# Altium footprint library core.PcbLib: 29 footprints (part 2 of 2)
Each footprint in its own frame and in the unit in brackets; x right, y up, seen from the top. Pads: shape width x height; smd on the part's side, far side on the other; paste and mask are expansions set on the pad; w line width, h text height; cw(c..) or ccw(c..) is an arc to the next point about the centre after c.
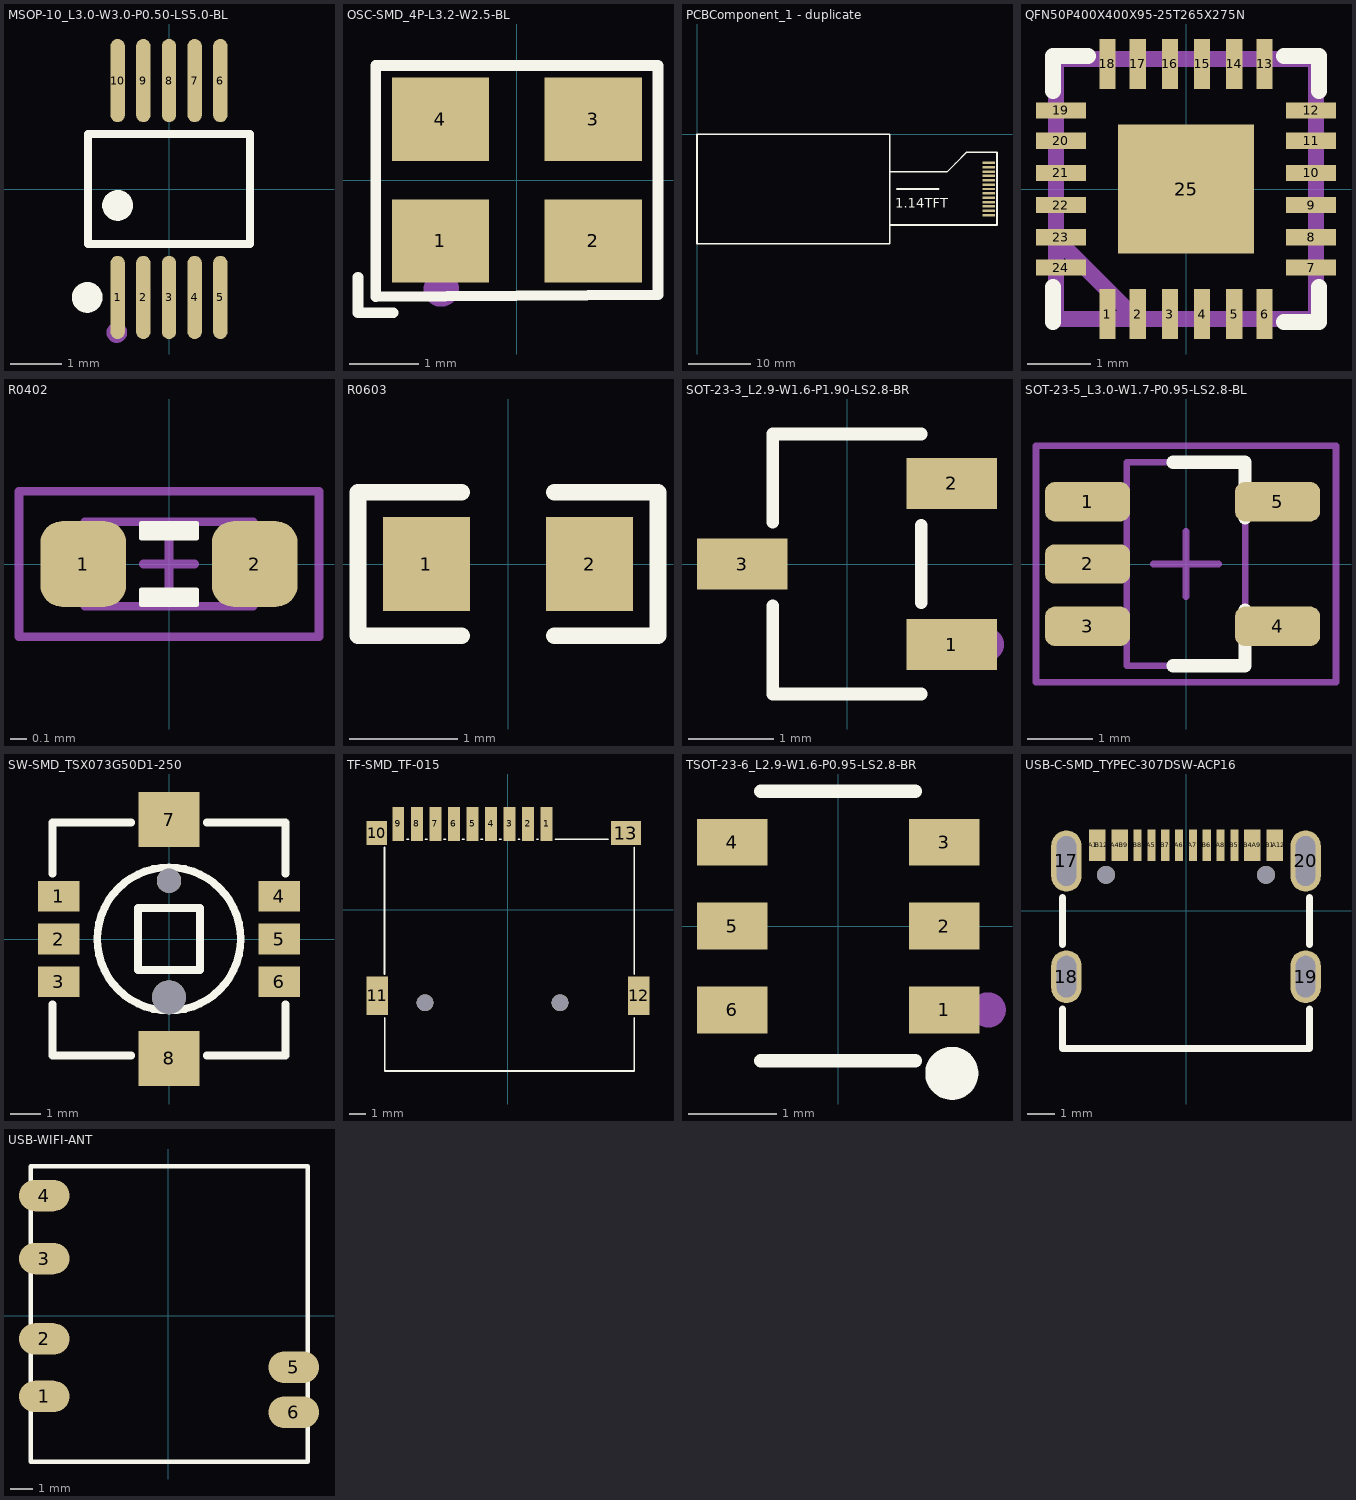
[diagram p1: the footprints below, top view; thin cyan lines are the x and y axes]

## MSOP-10_L3.0-W3.0-P0.50-LS5.0-BL [mm]
pads (10):
  oval 0.28x1.62 smd: 1(-1,-2.11) 2(-0.5,-2.11) 3(0,-2.11) 4(0.5,-2.11) 5(1,-2.11) 6(1,2.11) 7(0.5,2.11) 8(0,2.11) 9(-0.5,2.11) 10(-1,2.11)
Top Overlay:
  circle w0.3: c-1,-0.319 r0.15
  circle w0.3: c-1.592,-2.11 r0.15
  lines w0.152: -1.576,-1.071 -1.576,1.071 1.576,1.071 1.576,-1.071 -1.576,-1.071
Mechanical 15:
  circle w0.2: c-1.016,-2.794 r0.1
3D body "User Library-MSOP-10-1.SLDPRT": height 1.05, standoff 0, extent -1.5,-2.514 1.5,2.514

## OSC-SMD_4P-L3.2-W2.5-BL [mm]
pads (4):
  rect 1.4x1.2 smd: 1(-1.1,-0.875) 2(1.1,-0.875) 3(1.1,0.875) 4(-1.1,0.875)
Top Overlay:
  lines w0.152: -2.286,-1.397 -2.286,-1.905 -1.778,-1.905 ; -2.029,-1.679 -2.029,1.651 2.032,1.651 2.032,0 2.032,-1.651 -2.029,-1.679
Mechanical 15:
  circle w0.254: c-1.088,-1.567 r0.127
  region: -1.486,-0.428 -1.45,-0.428 -1.45,-1.004 -1.486,-1.004
  region: -1.522,-0.428 -1.486,-0.428 -1.486,-1.004 -1.522,-1.004
  region: -1.558,-0.428 -1.522,-0.428 -1.522,-1.004 -1.558,-1.004
  region: -1.594,-0.464 -1.558,-0.464 -1.558,-1.004 -1.594,-1.004
  region: -1.63,-0.464 -1.594,-0.464 -1.594,-0.572 -1.63,-0.572
  region: -1.666,-0.5 -1.63,-0.5 -1.63,-0.608 -1.666,-0.608
  region: -1.702,-0.536 -1.666,-0.536 -1.666,-0.608 -1.702,-0.608
  region: -1.738,-0.536 -1.702,-0.536 -1.702,-0.608 -1.738,-0.608
3D body "User Library-tsx-3225-1.SLDPRT": height 0.6, standoff 0, extent -1.6,-1.27 1.6,1.23

## PCBComponent_1 - duplicate [mm]
pads (13):
  rect 2x0.4 smd: 1(47,-4.6) 2(47,-5.3) 3(47,-6) 4(47,-6.7) 5(47,-7.4) 6(47,-8.1) 7(47,-8.8) 8(47,-9.5) 9(47,-10.2) 10(47,-10.9) 11(47,-11.6) 12(47,-12.3) 13(47,-13)
Top Overlay:
  lines w0.254: 31,-14.6 31.567,-14.6 ; 31,-6.046 40.254,-6.046 41.6,-4.7 43.4,-2.9 48.3,-2.9 48.3,-14.6 48.2,-14.6 42.4,-14.6 31.367,-14.6 ; 32.2,-8.8 38.919,-8.8 ; 0,-17.6 0,0 31,0 31,-17.6 0,-17.6
  text "1.14TFT" at 31.9,-11.85 h1.5

## QFN50P400X400X95-25T265X275N [mil]
pads (25):
  rect 10.2x31.1 smd: 1(-49,-78) 2(-30,-78) 3(-10,-78) 4(10,-78) 5(30,-78) 6(49,-78) 13(49,78) 14(30,78) 15(10,78) 16(-10,78) 17(-30,78) 18(-49,78)
  rect 31.1x10.2 smd: 7(78,-49) 8(78,-30) 9(78,-10) 10(78,10) 11(78,30) 12(78,49) 19(-78,49) 20(-78,30) 21(-78,10) 22(-78,-10) 23(-78,-30) 24(-78,-49)
  rect 84.6x80.7 smd: 25(0,-0.03)
Top Overlay:
  lines w10: -83,-83 -83,-61 ; -83,61 -83,83 -61,83 ; 61,-83 83,-83 83,-61 ; 61,83 83,83 83,61
Mechanical 15:
  lines w10: -81,-31 -81,-81 -31,-81 ; -81,-31 -31,-81 ; -81,-31 -81,81 81,81 81,-81 -31,-81
3D body "User Library-QFN 24 4x4.SLDPRT": height 35.43, standoff 0, extent -78.82,-78.82 78.82,78.82

## R0402 [mil]
height 13.78
pads (2):
  rrect50% 20x20 smd: 1(-20,0) 2(20,0)
Top Overlay:
  region: 6.5,-9.5 -6.5,-9.5 -6.5,-6 6.5,-6
  region: -6.5,9.5 6.5,9.5 6.5,6 -6.5,6
  lines w1: -6.5,-9.5 6.5,-9.5 6.5,-6 -6.5,-6 -6.5,-9.5 ; -6.5,6 -6.5,9.5 6.5,9.5 6.5,6 -6.5,6
Mechanical 13:
  lines w2: -6,0 6,0 ; 0,-6 0,6 ; -19.69,-9.84 -19.69,9.84 19.68,9.84 19.68,-9.84 -19.69,-9.84
Mechanical 14:
  lines w2: -35,-17 35,-17 35,17 -35,17 -35,-17
3D body "RESC1005X03L.step": height 13.78, standoff 0, extent -19.68,-9.84 19.69,9.85

## R0603 [mm]
pads (2):
  rect 0.806x0.864 smd: 1(-0.753,0) 2(0.753,0)
Top Overlay:
  lines w0.152: -0.426,-0.661 -1.385,-0.661 -1.385,0.661 -0.426,0.661 ; 0.426,-0.661 1.385,-0.661 1.385,0.661 0.426,0.661
Top Paste:
  region: 1.195,0.45 0.395,0.45 0.345,0.4 0.345,0.172 0.715,0.172 0.715,-0.158 0.345,-0.158 0.345,-0.4 0.395,-0.45 1.195,-0.45 1.245,-0.4 1.245,0.4
  region: -0.355,0.4 -0.355,0.172 -0.735,0.172 -0.735,-0.158 -0.355,-0.158 -0.355,-0.4 -0.405,-0.45 -1.195,-0.45 -1.245,-0.4 -1.245,0.4 -1.195,0.45 -0.405,0.45
3D body "User Library-User Library-res0603_res0603_body.SLDPRT": height 0.51, standoff 0, extent -0.8,-0.406 0.8,0.406

## SOT-23-3_L2.9-W1.6-P1.90-LS2.8-BR [mm]
pads (3):
  rect 1.07x0.6 smd: 1(1.235,-0.95) 2(1.235,0.95) 3(-1.235,0)
Top Overlay:
  lines w0.152: -0.876,-0.495 -0.876,-1.536 0.876,-1.536 ; -0.876,0.495 -0.876,1.536 0.876,1.536 ; 0.876,-0.455 0.876,0.455
Mechanical 15:
  circle w0.2: c1.651,-0.95 r0.1
3D body "User Library-3-lead sot23-3.SLDPRT": height 1.03, standoff 0.01, extent -1.353,-1.46 1.123,1.46

## SOT-23-5_L3.0-W1.7-P0.95-LS2.8-BL [mm] "SOT23, 3-Leads, Body 3.1x3.0mm (max), Pitch 0.95mm, IPC Medium Density"
height 1.2
pads (5):
  rrect50% 1.3x0.6 smd: 1(-1.5,0.95) 2(-1.5,0) 3(-1.5,-0.95) 4(1.396,-0.95) 5(1.396,0.95)
Top Overlay:
  lines w0.2: -0.2,-1.55 0.9,-1.55 0.9,-0.7 ; -0.2,1.55 0.9,1.55 0.9,0.7
Mechanical 13:
  lines w0.1: -0.9,-1.55 -0.9,1.55 0.9,1.55 0.9,-1.55 -0.9,-1.55
Mechanical 15:
  lines w0.1: -0.5,0 0.5,0 ; 0,-0.5 0,0.5 ; -2.286,-1.8 -2.286,1.8 2.286,1.8 2.286,-1.8 -2.286,-1.8
3D body "PCB1.stp": height 1.2, standoff 0, extent -1.476,-1.452 1.324,1.448

## SW-SMD_TSX073G50D1-250 [mm]
pads (10):
  rect 1.35x1 smd: 1(-3.6,1.4) 2(-3.6,0) 3(-3.6,-1.4) 4(3.6,1.4) 5(3.6,0) 6(3.6,-1.4)
  rect 2x1.8 smd: 7(0,3.9) 8(0,-3.9)
  round 1.1 hole 1.1 unplated: ""(0,-1.9)
  round 0.8 hole 0.8 unplated: ""(0,1.9)
Top Overlay:
  circle w0.254: c0,0 r2.342
  lines w0.254: -3.81,-2.131 -3.81,-3.81 -1.231,-3.81 ; -3.81,2.131 -3.81,3.81 -1.231,3.81 ; 1.231,-3.81 3.81,-3.81 3.81,-2.131 ; 1.231,3.81 3.81,3.81 3.81,2.131 ; -1.016,-1.016 1.016,-1.016 1.016,1.016 -1.016,1.016 -1.016,-1.016

## TF-SMD_TF-015 [mm]
pads (15):
  rect 0.7x2 smd: 1(2.303,5.095) 2(1.209,5.093) 3(0.113,5.095) 4(-0.986,5.095) 5(-2.085,5.095) 6(-3.183,5.095) 7(-4.28,5.095) 8(-5.378,5.095) 9(-6.482,5.095)
  rect 1.2x1.397 smd: 10(-7.765,4.557)
  rect 1.27x2.286 smd: 11(-7.73,-5.095) 12(7.764,-5.095)
  rect 1.778x1.397 smd: 13(7.002,4.557)
  round 1 hole 1 unplated: ""(-4.897,-5.507) ""(3.103,-5.504)
Top Overlay:
  lines w0.102: -7.296,-3.797 -7.296,3.703 ; -7.295,-6.393 -7.295,-9.545 7.503,-9.545 7.503,-6.393 ; -5.977,4.19 -5.883,4.19 ; -4.873,4.19 -4.785,4.19 ; -3.775,4.19 -3.688,4.19 ; -2.679,4.19 -2.59,4.19 ; -1.58,4.19 -1.491,4.19 ; -0.482,4.19 -0.392,4.19 ; 0.618,4.19 0.705,4.19 ; 1.714,4.19 1.804,4.19 ; 2.814,4.19 5.959,4.19 ; 7.503,-3.797 7.503,3.703
3D body "User Library-Micro_SD_Socket_Push-push.SLDPRT": height 1.85, standoff -0.6, extent -7.972,-9.406 8.128,5.596

## TSOT-23-6_L2.9-W1.6-P0.95-LS2.8-BR [mm]
pads (6):
  rect 0.8x0.532 smd: 1(1.2,-0.95) 2(1.2,0) 3(1.2,0.95) 4(-1.2,0.95) 5(-1.2,0) 6(-1.2,-0.95)
Top Overlay:
  circle w0.3: c1.287,-1.669 r0.15
  lines w0.152: -0.876,-1.526 0.876,-1.526 ; -0.876,1.526 0.876,1.526
Mechanical 15:
  circle w0.2: c1.7,-0.95 r0.1
3D body "User Library-SOT23-6-1.SLDPRT": height 1.09, standoff 0, extent -1.213,-1.397 1.213,1.397

## USB-C-SMD_TYPEC-307DSW-ACP16 [mm]
pads (22):
  oval 1.1x2.2 hole 0.7 slot 1.8 at 90 deg: 17(-4.32,1.808) 20(4.32,1.808)
  oval 1.1x1.9 hole 0.7 slot 1.5 at 90 deg: 18(-4.32,-2.373) 19(4.32,-2.373)
  rect 0.3x1.15 smd: A1(-3.35,2.373) A4(-2.55,2.373) A5(-1.25,2.373) A6(-0.25,2.373) A7(0.25,2.373) A8(1.25,2.373) A9(2.55,2.372) A12(3.35,2.373) B1(3.05,2.373) B4(2.25,2.372) B5(1.75,2.373) B6(0.75,2.373) B7(-0.75,2.373) B8(-1.75,2.373) B9(-2.25,2.373) B12(-3.05,2.373)
  round 0.65 hole 0.65 unplated: ""(-2.89,1.307) ""(2.89,1.307)
Top Overlay:
  lines w0.254: -4.47,-3.539 -4.47,-4.973 4.47,-4.973 4.47,-3.539 ; -4.47,-1.206 -4.47,0.491 ; 4.47,-1.206 4.47,0.491
3D body "User Library-USB Type C Port (SMD Type).SLDPRT": height 3.26, standoff -0.94, extent -4.47,-5.014 4.47,2.886

## USB-WIFI-ANT [mm]
pads (6):
  oval 2.254x1.4 smd: 1(-5.512,-3.598) 2(-5.512,-1.042) 3(-5.512,2.534) 4(-5.512,5.334) 5(5.569,-2.298) 6(5.569,-4.298)
Top Overlay:
  lines w0.2: -6.112,-6.498 -6.112,6.634 6.204,6.634 6.204,-6.498 -6.096,-6.498
3D body "User Library-JCX12.STEP": height 1.9, standoff 0.01, extent -6.024,-6.45 6.176,6.45